# Altium footprint library MyPcbLib.PcbLib: 657 footprints (part 1 of 42)
Each footprint in its own frame and in the unit in brackets; x right, y up, seen from the top. Pads: shape width x height; smd on the part's side, far side on the other; paste and mask are expansions set on the pad; w line width, h text height; cw(c..) or ccw(c..) is an arc to the next point about the centre after c.
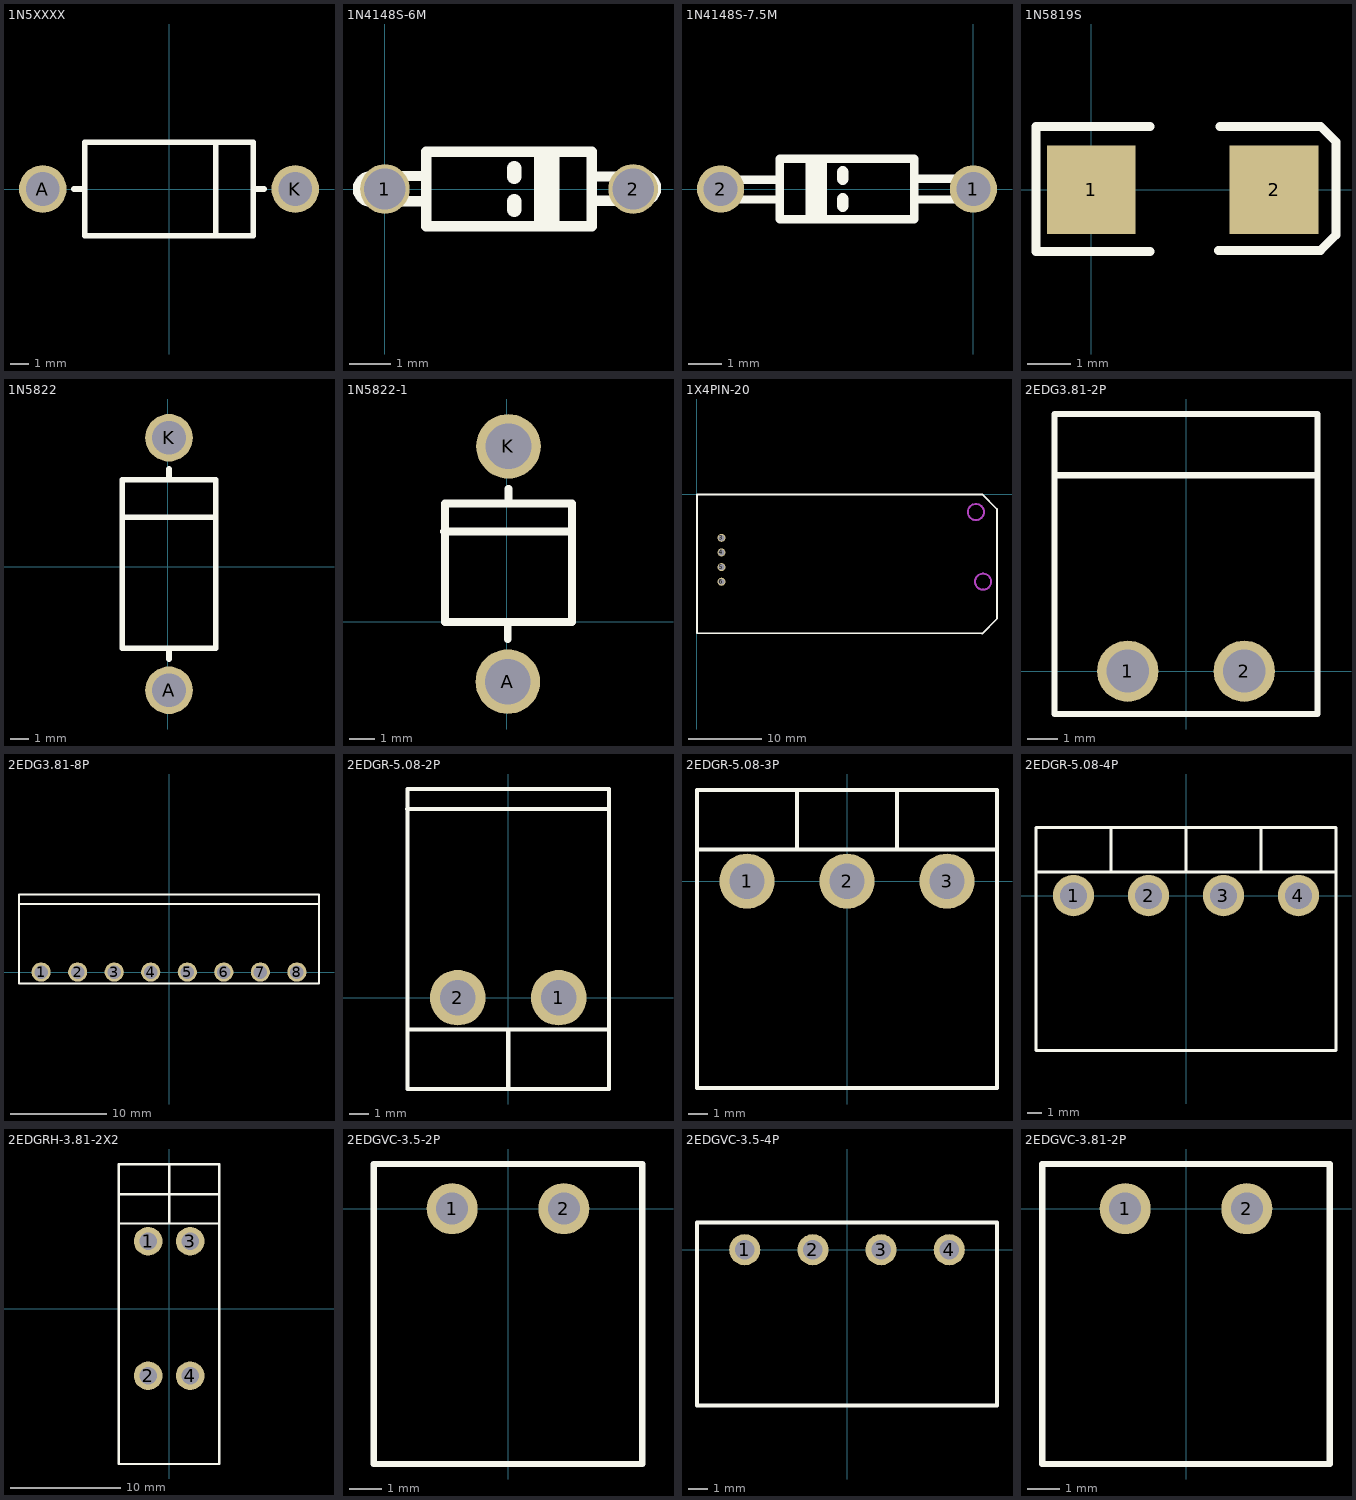
[diagram p0: the footprints below, top view; thin cyan lines are the x and y axes]

## 1N5XXXX [mm]
pads (2):
  round 2.54 hole 1.8: A(-6.75,0) K(6.75,0)
Top Overlay:
  lines w0.305: -5.08,0 -4.5,0 ; 2.5,-2.5 2.5,2.5 ; 4.5,0 5.08,0 ; -4.5,-2.5 -4.5,2.5 4.5,2.5 4.5,-2.5 -4.5,-2.5
3D body: height 5, standoff -2, extent -7.428,-2.46 7.072,2.54

## 1N4148S-6M [mm]
pads (2):
  round 1.2 / inner round 1.2 / far side round 2 hole 1: 1(0,0) 2(6,0)
Top Overlay:
  lines w0.2: 4.125,-0.8 4.125,0.9
  lines w0.25: 3.725,-0.9 3.725,0.9 ; 3.825,-0.9 3.825,0.9 ; 4.025,-0.9 4.025,0.9
  lines w0.254: 1,-0.3 -0.35,-0.3 cw(c-0.35,0) -0.35,0.3 1,0.32 ; 5,0.3 6.25,0.32 cw(c6.25,0.02) 6.25,-0.28 5.05,-0.28 ; 1,-0.9 5,-0.9 5,0.9 1,0.9 1,-0.9
  lines w0.35: 3.125,-0.5 3.125,-0.3 ; 3.125,0.3 3.125,0.5

## 1N4148S-7.5M [mm]
pads (2):
  round 1.4 / inner round 1.4 / far side round 2 hole 1: 1(0,0) 2(-7.5,0)
Top Overlay:
  lines w0.2: -4.875,-0.9 -4.875,0.8
  lines w0.25: -4.775,-0.9 -4.775,0.9 ; -4.575,-0.9 -4.575,0.9 ; -4.475,-0.9 -4.475,0.9
  lines w0.254: -5.8,0.28 -7.69,0.28 ccw(c-7.69,-0.02) -7.69,-0.32 -5.75,-0.3 ; -1.75,-0.32 0.13,-0.3 ccw(c0.13,0) 0.13,0.3 -1.75,0.3 ; -5.75,-0.9 -5.75,0.9 -1.75,0.9 -1.75,-0.9 -5.75,-0.9
  lines w0.35: -3.875,-0.5 -3.875,-0.3 ; -3.875,0.3 -3.875,0.5

## 1N5819S [mil]
height 9.5
pads (2):
  rect 80x80 smd: 1(0,0) 2(165,0)
Top Overlay:
  lines w8: 53,-56 -50,-56 -50,57 53,57 ; 115,-55 207,-55 221,-41 221,43 207,57 116,57

## 1N5822 [mm]
pads (2):
  round 2.54 hole 1.8: A(0.076,-6.594) K(0.076,6.906)
Top Overlay:
  lines w0.305: -2.424,2.656 2.576,2.656 ; 0.076,-4.924 0.076,-4.344 ; 0.076,4.656 0.076,5.236 ; -2.424,-4.344 -2.424,4.656 2.576,4.656 2.576,-4.344 -2.424,-4.344
3D body: height 5, standoff -2, extent -2.464,-7.272 2.536,7.228

## 1N5822-1 [mm]
pads (2):
  round 2.54 hole 1.8: A(0.051,-2.352) K(0.076,6.906)
Top Overlay:
  lines w0.305: -2.46,3.556 2.54,3.556 ; 0.051,-0.682 0.051,-0.102 ; 0.076,4.656 0.076,5.236 ; -2.424,0 2.576,0 2.576,4.656 -2.424,4.656 -2.424,0

## 1X4PIN-20 [mm]
pads (4):
  round 1.1 hole 0.8: 3(3.353,-5.93) 4(3.353,-7.93) 5(3.353,-9.93) 6(3.353,-11.93)
Top Overlay:
  lines w0.254: 38.992,-19.03 41.024,-16.998 ; 38.992,0.02 41.024,-2.012 ; 39.003,-18.98 0.003,-18.98 0.003,0.02 39.003,0.02 ; 41.003,-16.98 41.003,-1.98
Keep-Out Layer:
  circle w0.254: c39.12,-11.92 r1.1
  circle w0.254: c38.14,-2.399 r1.1
Mechanical 1:
  circle w0.254: c39.12,-11.92 r1.1
  circle w0.254: c38.14,-2.399 r1.1

## 2EDG3.81-2P [mm]
pads (2):
  round 2 hole 1.4: 1(-1.905,0) 2(1.905,0)
Top Overlay:
  lines w0.203: -4.242,6.4 4.242,6.4 ; -4.3,-1.4 -4.3,8.4 4.3,8.4 4.3,-1.4 -4.3,-1.4
3D body: height 7.2, standoff -3.07, extent -4.115,-1.323 4.195,7.877

## 2EDG3.81-8P [mm]
pads (8):
  round 2 hole 1.4: 1(-13.335,0) 2(-9.525,0) 3(-5.715,0) 4(-1.905,0) 5(1.905,0) 6(5.715,0) 7(9.525,0) 8(13.335,0)
Top Overlay:
  lines w0.203: -15.64,7.1 15.64,7.1 ; -15.64,-1.2 -15.64,8.1 15.64,8.1 15.64,-1.2 -15.64,-1.2
3D body: height 7.2, standoff -3, extent -15.57,-1.196 15.71,8.104

## 2EDGR-5.08-2P [mm]
pads (2):
  round 2.8 hole 1.8: 1(2.54,0) 2(-2.54,0)
Top Overlay:
  lines w0.203: -5.105,9.5 5.055,9.5 ; -5.08,-1.651 -5.08,10.439 ; -5.08,10.5 5.08,10.5 ; 0,-4.47 0,-1.6 ; 5.08,10.49 5.08,-1.6 ; 5.08,-1.6 -5.08,-1.6 -5.08,-4.597 5.08,-4.597 5.08,-1.6
3D body: height 8.1, standoff -3, extent -5.054,-1.757 5.106,10.343

## 2EDGR-5.08-3P [mm]
pads (3):
  round 2.8 hole 1.8: 1(-5.08,0) 2(0,0) 3(5.08,0)
Top Overlay:
  lines w0.203: -7.62,-10.5 7.62,-10.5 ; -7.62,-10.49 -7.62,1.6 7.62,1.6 7.62,-10.439 ; -7.62,1.626 -7.62,4.623 7.62,4.623 7.62,1.626 ; -2.54,1.626 -2.54,4.547 ; 2.54,1.626 2.54,4.547

## 2EDGR-5.08-4P [mm]
pads (4):
  round 2.8 hole 1.8: 1(-7.62,0) 2(-2.54,0) 3(2.54,0) 4(7.62,0)
Top Overlay:
  lines w0.203: -10.16,-10.5 10.16,-10.5 ; -10.16,-10.49 -10.16,1.6 10.16,1.6 ; -10.16,1.626 -10.16,4.623 10.16,4.623 ; -5.08,1.626 -5.08,4.547 ; 0,1.626 0,4.547 ; 5.08,1.626 5.08,4.623 ; 10.16,-10.439 10.16,1.6 ; 10.16,4.597 10.16,1.6

## 2EDGRH-3.81-2X2 [mm]
pads (4):
  round 2.6 hole 1.6: 1(-1.905,6.1) 2(-1.905,-6.1) 3(1.905,6.1) 4(1.905,-6.1)
Top Overlay:
  lines w0.203: -4.572,-14.072 -4.572,7.696 ; -4.572,10.363 4.521,10.363 ; -4.572,13.106 -4.572,7.7 4.535,7.7 ; -4.535,-14.1 4.535,-14.1 ; -4.521,13.081 4.496,13.081 ; 0,7.722 0,13.081 ; 4.547,-14.097 4.547,7.696 ; 4.547,7.595 4.547,13.106

## 2EDGVC-3.5-2P [mm]
pads (2):
  round 1.6 hole 1: 1(-1.75,0) 2(1.75,0)
Top Overlay:
  lines w0.203: -4.2,-8 4.2,-8 4.2,1.4 -4.2,1.4 -4.2,-8

## 2EDGVC-3.5-4P [mm]
pads (4):
  round 1.6 hole 1: 1(-5.25,0) 2(-1.75,0) 3(1.75,0) 4(5.25,0)
Top Overlay:
  lines w0.203: -7.7,-8 7.7,-8 7.7,1.4 -7.7,1.4 -7.7,-8

## 2EDGVC-3.81-2P [mm]
pads (2):
  round 1.6 hole 1: 1(-1.905,0) 2(1.905,0)
Top Overlay:
  lines w0.203: -4.5,-8 4.5,-8 4.5,1.4 -4.5,1.4 -4.5,-8